# Altium footprint library CONN_RJ.PcbLib: 38 footprints (part 2 of 3)
Each footprint in its own frame and in the unit in brackets; x right, y up, seen from the top. Pads: shape width x height; smd on the part's side, far side on the other; paste and mask are expansions set on the pad; w line width, h text height; cw(c..) or ccw(c..) is an arc to the next point about the centre after c.
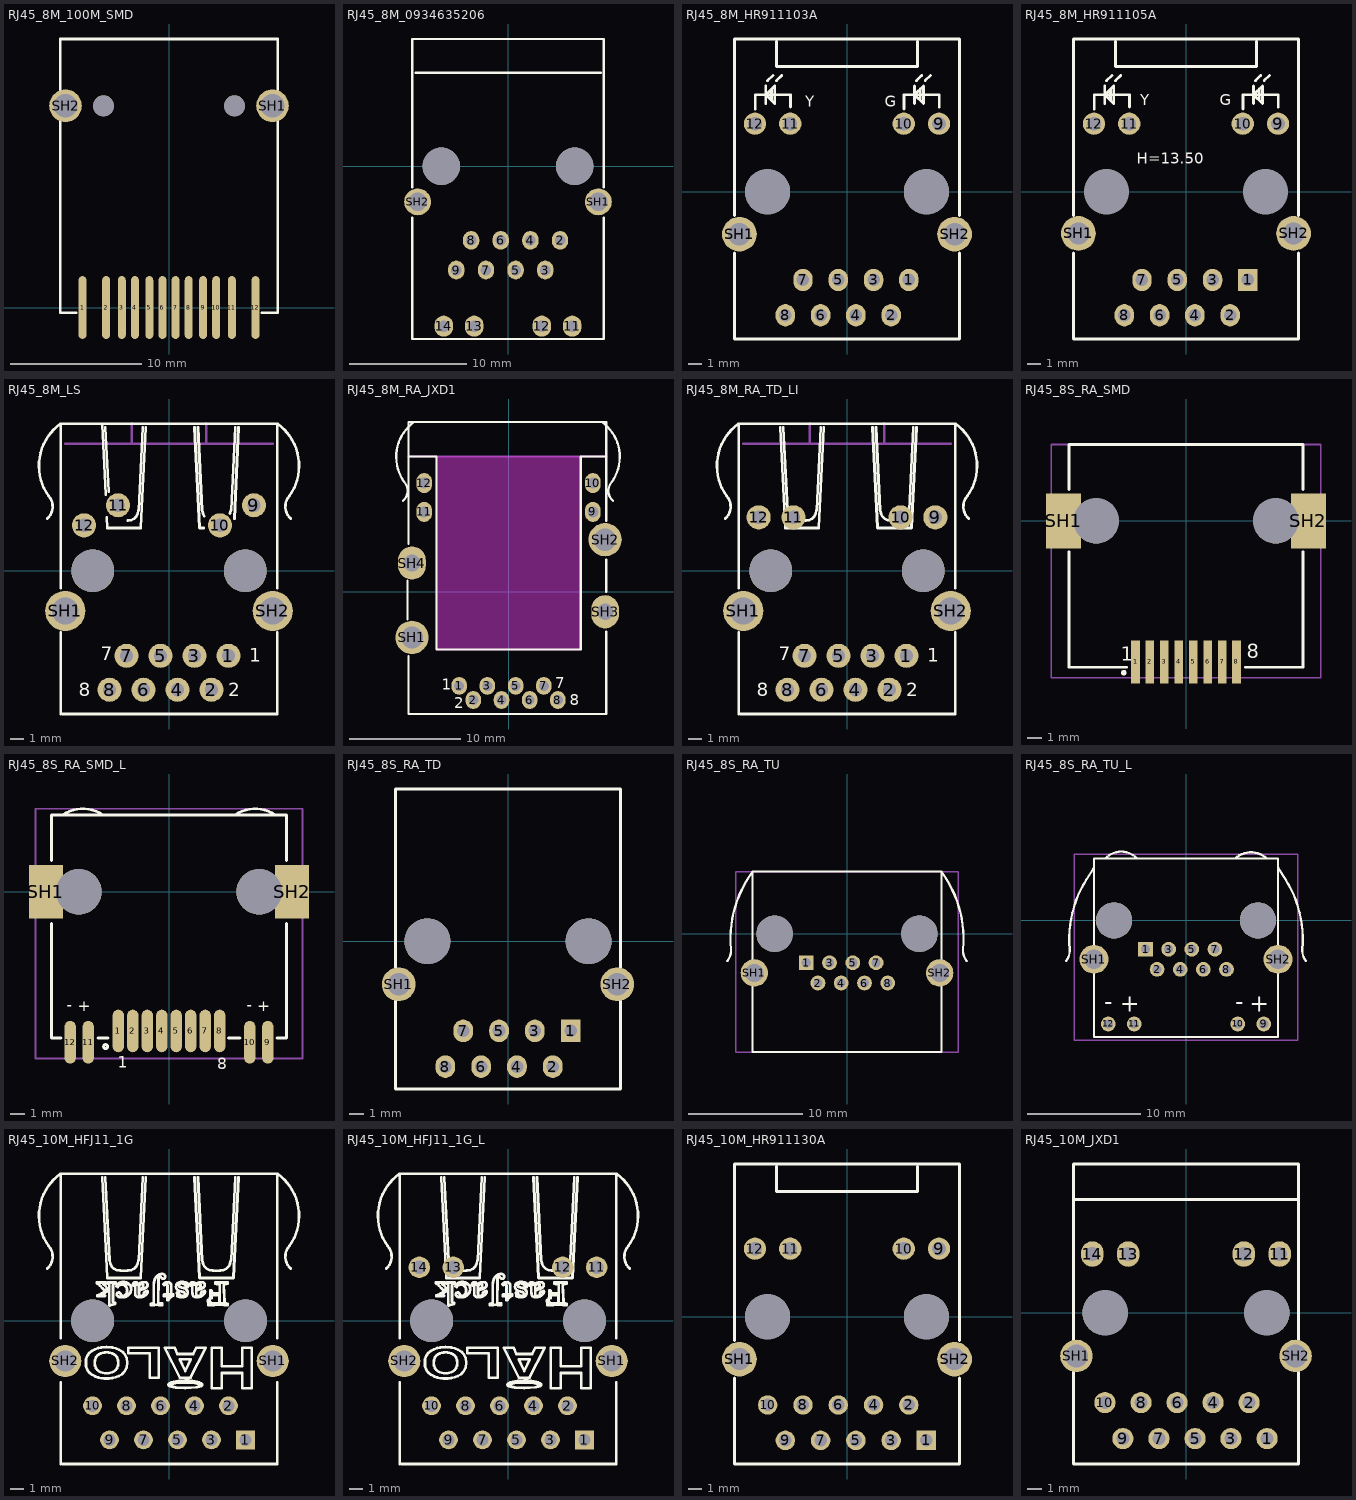
[diagram p1: the footprints below, top view; thin cyan lines are the x and y axes]

## RJ45_8M_100M_SMD [mm] "RJ45, 10/100BASE, MOLEX SMD WITH G/Y LED"
pads (16):
  oval 0.6x4.8 smd: 1(-6.6,0) 2(-4.8,0) 3(-3.6,0) 4(-2.6,0) 5(-1.5,0) 6(-0.5,0) 7(0.5,0) 8(1.5,0) 9(2.6,0) 10(3.6,0) 11(4.8,0) 12(6.6,0)
  round 2.5 hole 1.8: SH1(7.9,15.4) SH2(-7.9,15.4)
  round 1.6 hole 1.6: ""(-5,15.4) ""(5,15.4)
Top Overlay:
  lines w0.2: -7.1,-0.4 -8.3,-0.4 -8.3,20.5 8.3,20.5 8.3,-0.4 7.1,-0.4
3D body "480749001.stp": height 14.51, standoff -3.7, extent -9.153,-1.375 9.153,20.355

## RJ45_8M_0934635206 [mm] "RJ45, 10/100BASE, Up Tab, 0934635206 MOLEX"
height 14
pads (16):
  oval 1.4x1.6 hole 0.9: 2(4.46,-6.35) 3(3.19,-8.89) 4(1.92,-6.35) 5(0.65,-8.89) 6(-0.62,-6.35) 7(-1.89,-8.89) 8(-3.16,-6.35) 9(-4.43,-8.89)
  oval 1.6x1.8 hole 1: 11(5.5,-13.7) 12(2.9,-13.7) 13(-2.9,-13.7) 14(-5.5,-13.7)
  round 2.3 hole 1.6: SH1(7.745,-3.05) SH2(-7.745,-3.05)
  round 3.2 hole 3.2 unplated: ""(-5.715,0) ""(5.715,0)
Top Overlay:
  lines w0.2: -8.2,-4.4 -8.2,-14.8 8.2,-14.8 8.2,-4.4 ; -8.2,-1.8 -8.2,10.9 8.2,10.9 8.2,-1.8 ; -7.915,8.02 7.95,8.02
3D body "934635206.stp": height 14.14, standoff -3.26, extent -8.12,-14.6 8.12,10.8

## RJ45_8M_HR911103A [mm] "RJ45, 10/100BASE, HR911103A WITH G/Y LED"
height 10
pads (16):
  oval 1.4x1.6 hole 0.9: 1(4.45,-6.35) 2(3.18,-8.89) 3(1.91,-6.35) 4(0.64,-8.89) 5(-0.63,-6.35) 6(-1.9,-8.89) 7(-3.17,-6.35) 8(-4.44,-8.89)
  round 1.6 hole 1: 9(6.625,4.9) 10(4.085,4.9) 11(-4.085,4.9) 12(-6.625,4.9)
  round 2.5 hole 1.63: SH1(-7.745,-3.05) SH2(7.745,-3.05)
  round 3.251 hole 3.251 unplated: ""(-5.715,0) ""(5.715,0)
Top Overlay:
  lines w0.2: -8.1,-4.4 -8.1,-10.6 8.1,-10.6 8.1,-4.4 ; -8.1,-1.7 -8.1,11 8.1,11 8.1,-1.7 ; -6.604,5.969 -6.604,6.985 -4.064,6.985 -4.064,6.096 ; -5.842,6.35 -5.842,7.62 ; -5.715,8.001 -5.334,8.382 ; -5.434,6.592 -5.434,7.393 ; -5.08,8.001 -4.699,8.382 ; -5.08,10.795 -5.08,9.017 5.08,9.017 5.08,10.795 ; 4.106,5.969 4.106,6.985 6.646,6.985 6.646,6.096 ; 4.868,6.35 4.868,7.62 ; 4.995,8.001 5.376,8.382 ; 5.276,6.592 5.276,7.393 ; 5.63,8.001 6.011,8.382 ; -5.842,6.985 -5.207,7.62 -5.207,6.35 -5.842,6.985 ; 4.868,6.985 5.503,7.62 5.503,6.35 4.868,6.985
  text "G" at 2.713,6.123 h0.8
  text "Y" at -3.002,6.123 h0.8
3D body "User Library-HR911130A.STEP": height 13.5, standoff -3, extent -7.94,-10.5 7.94,10.9

## RJ45_8M_HR911105A [mm] "RJ45, 10/100BASE, HR911105A WITH G/Y LED"
height 14.8
pads (16):
  rect 1.4x1.6 hole 0.9: 1(4.45,-6.35)
  oval 1.4x1.6 hole 0.9: 2(3.18,-8.89) 3(1.91,-6.35) 4(0.64,-8.89) 5(-0.63,-6.35) 6(-1.9,-8.89) 7(-3.17,-6.35) 8(-4.44,-8.89)
  round 1.6 hole 1: 9(6.625,4.9) 10(4.085,4.9) 11(-4.085,4.9) 12(-6.625,4.9)
  round 2.5 hole 1.6: SH1(-7.745,-3) SH2(7.745,-3)
  round 2.95 hole 3.25 unplated: ""(-5.715,0) ""(5.715,0)
Top Overlay:
  lines w0.2: -8.1,-4.4 -8.1,-10.6 8.1,-10.6 8.1,-4.4 ; -8.1,-1.7 -8.1,11 8.1,11 8.1,-1.7 ; -6.604,5.969 -6.604,6.985 -4.064,6.985 -4.064,6.096 ; -5.842,6.35 -5.842,7.62 ; -5.715,8.001 -5.334,8.382 ; -5.434,6.592 -5.434,7.393 ; -5.08,8.001 -4.699,8.382 ; -5.08,10.795 -5.08,9.017 5.08,9.017 5.08,10.795 ; 4.106,5.969 4.106,6.985 6.646,6.985 6.646,6.096 ; 4.868,6.35 4.868,7.62 ; 4.995,8.001 5.376,8.382 ; 5.276,6.592 5.276,7.393 ; 5.63,8.001 6.011,8.382 ; -5.842,6.985 -5.207,7.62 -5.207,6.35 -5.842,6.985 ; 4.868,6.985 5.503,7.62 5.503,6.35 4.868,6.985
  text "G" at 2.413,6.223 h0.8
  text "Y" at -3.302,6.223 h0.8
  text "H=13.50" at -3.556,2.032 h0.8
3D body "User Library-HR911105A.step": height 13.5, standoff -3, extent -7.94,-10.5 7.94,10.9

## RJ45_8M_LS [mm] "HALO Ethernet FASTJACK with LED STAGGERED, RB1-125BAG1A"
pads (16):
  round 1.8 hole 1: 1(4.445,-6.35) 2(3.175,-8.89) 3(1.905,-6.35) 4(0.635,-8.89) 5(-0.635,-6.35) 6(-1.905,-8.89) 7(-3.175,-6.35) 8(-4.445,-8.89) 9(6.35,4.9) 10(3.81,3.4) 11(-3.81,4.9) 12(-6.35,3.4)
  round 3 hole 2: SH1(-7.75,-3) SH2(7.75,-3)
  round 3.2 hole 3.2 unplated: ""(-5.7,0) ""(5.7,0)
Top Overlay:
  lines w0.2: -9.1,3.9 ccw(c-9.9,4.8) -9,5.6 cw(c-5.85,7.85) -8.1,11 ; -8.1,-10.7 -8.1,-4.6 ; -8.1,-1.3 -8.1,11 ; -7.958,-10.7 8.1,-10.7 8.1,-4.6 ; -4.992,10.939 -4.737,5.698 ; -4.756,10.739 -4.5,5.9 ; -4.664,4.007 -4.625,3.206 -2.105,3.206 -1.738,10.739 ; -3.076,3.758 -2.84,3.784 -2.63,3.889 -2.446,4.072 -2.341,4.282 -2.289,4.519 ; -2.263,4.519 -1.974,10.739 ; 1.911,10.739 2.278,3.206 2.594,3.206 ; 2.173,10.739 2.462,4.519 ; 2.488,4.519 2.541,4.282 2.646,4.072 ; 4.561,4.282 4.614,4.519 ; 4.64,4.519 4.955,10.739 ; 4.9,3.9 5.191,10.739 ; 8.1,-1.3 8.1,11 ; 9.1,3.9 cw(c9.9,4.8) 9,5.6 ccw(c5.85,7.85) 8.1,11 ; -8.1,11 8.1,11
  text "8" at -6.731,-9.366 h1
  text "7" at -5.1,-6.7 h1
  text "2" at 4.445,-9.366 h1
  text "1" at 6,-6.8 h1
Mechanical 1:
  lines w0.2: -7.747,9.5 7.747,9.5 ; -2.794,9.5 -2.794,11 ; 2.794,9.5 2.794,11
3D body "User Library-HFJ11-1G01ER.step": height 15.82, standoff -2.88, extent -9.887,-10.8 10.106,10.99

## RJ45_8M_RA_JXD1 [mm] "Ethernet 10/100 JXD1-1001NL"
pads (16):
  oval 1.4x1.6 hole 0.9 mask+0.1: 1(-4.445,-8.47) 2(-3.175,-9.74) 3(-1.905,-8.47) 4(-0.635,-9.74) 5(0.635,-8.47) 6(1.905,-9.74) 7(3.175,-8.47) 8(4.445,-9.74)
  oval 1.4x1.8 hole 1 mask+0.1: 9(7.6,7.2) 10(7.6,9.8) 11(-7.6,7.2) 12(-7.6,9.8)
  round 3 hole 2: SH1(-8.7,-4.1) SH2(8.7,4.7)
  oval 2.5x3 hole 1.5 unplated: SH3(8.7,-1.8) SH4(-8.7,2.6)
Top Overlay:
  lines w0.2: -9.5,8.2 ccw(c-10.3,9.1) -9.4,9.9 cw(c-6.25,12.15) -8.5,15.3 ; -9.1,-2.5 -9.1,1 ; -9,-5.8 -9,-11 8.8,-11 8.8,-3.6 ; -9,4.3 -9,15.3 8.8,15.3 8.8,6.4 ; -9,12.2 -6.5,12.2 -6.5,-5.2 6.5,-5.2 6.5,12.2 8.8,12.2 ; 8.4,15.3 cw(c6.15,12.15) 9.3,9.9 ccw(c10.2,9.1) 9.4,8.2 ; 8.8,0 8.8,2.9
  text "1" at -6,-8.8 h1
  text "2" at -4.9,-10.5 h1
  text "7" at 4.2,-8.7 h1
  text "8" at 5.5,-10.2 h1
Keep-Out Layer:
  board cut-out: -6.5,12.2 -6.5,-5.2 6.5,-5.2 6.5,12.2
  lines w0.2: -6.5,12.2 -6.5,-5.2 6.5,-5.2 6.5,12.2
Mechanical 1:
  lines w0.2: -9,12.2 8.8,12.2
3D body "JXD1-1001NL.STEP": height 10.25, standoff -3.24, extent -10.189,-10.9 10.189,15.16

## RJ45_8M_RA_TD_LI [mm] "Ethernet FASTJACK MAGJACK with LED INLINE"
pads (16):
  round 1.8 hole 1 mask+0.1: 1(4.445,-6.35) 2(3.175,-8.89) 3(1.905,-6.35) 4(0.635,-8.89) 5(-0.635,-6.35) 6(-1.905,-8.89) 7(-3.175,-6.35) 8(-4.445,-8.89) 9(6.6,4) 10(4,4) 11(-4,4) 12(-6.6,4)
  round 3 hole 2: SH1(-7.75,-3) SH2(7.75,-3)
  round 3.2 hole 3.2 unplated: ""(-5.7,0) ""(5.7,0)
Top Overlay:
  lines w0.2: -9.1,3.9 ccw(c-9.9,4.8) -9,5.6 cw(c-5.85,7.85) -8.1,11 ; -8.1,-10.7 -8.1,-4.6 ; -8.1,-1.3 -8.1,11 ; -7.958,-10.7 8.1,-10.7 8.1,-4.6 ; -4.992,10.739 -4.625,3.206 -2.105,3.206 -1.738,10.739 ; -4.756,10.739 -4.441,4.519 -4.389,4.282 -4.284,4.072 -4.1,3.889 -3.89,3.784 -3.654,3.758 ; -3.654,3.731 -3.076,3.731 ; -3.076,3.758 -2.84,3.784 -2.63,3.889 -2.446,4.072 -2.341,4.282 -2.289,4.519 ; -2.263,4.519 -1.974,10.739 ; 1.911,10.739 2.278,3.206 4.824,3.206 5.191,10.739 ; 2.173,10.739 2.462,4.519 ; 2.488,4.519 2.541,4.282 2.646,4.072 2.829,3.889 3.039,3.784 3.275,3.758 ; 3.275,3.731 3.827,3.731 ; 3.827,3.758 4.063,3.784 4.273,3.889 4.457,4.072 4.561,4.282 4.614,4.519 ; 4.64,4.519 4.955,10.739 ; 8.1,-1.3 8.1,11 ; 9.1,3.9 cw(c9.9,4.8) 9,5.6 ccw(c5.85,7.85) 8.1,11 ; -8.1,11 8.1,11
  text "1" at 6,-6.8 h1
  text "2" at 4.445,-9.366 h1
  text "7" at -5.1,-6.7 h1
  text "8" at -6.731,-9.366 h1
Mechanical 1:
  lines w0.2: -7.747,9.5 7.747,9.5 ; -2.794,9.5 -2.794,11 ; 2.794,9.5 2.794,11
3D body "RJ45_45855.stp": height 15.09, standoff -3.47, extent -9.163,-10.92 9.163,10.92

## RJ45_8S_RA_SMD [mm] "RJ45, 8P8C, RightAngle, TabUp, SMD, WURTH 634008149721"
height 13
pads (12):
  rect 0.61x3.05 smd: 1(-3.57,-9.98) 2(-2.55,-9.98) 3(-1.53,-9.98) 4(-0.51,-9.98) 5(0.51,-9.98) 6(1.53,-9.98) 7(2.55,-9.98) 8(3.57,-9.98)
  rect 2.5x3.89 smd: SH1(-8.66,0) SH2(8.66,0)
  round 3.2 hole 3.2 unplated: ""(-6.35,0) ""(6.35,0)
Top Overlay:
  circle w0.2: c-4.4,-10.74 r0.1
  lines w0.2: -8.275,-2.19 -8.275,-10.35 -4.2,-10.35 ; -8.275,2.21 -8.275,5.4 8.275,5.4 8.275,2.21 ; 4.2,-10.35 8.275,-10.35 8.275,-2.19
  text "8" at 4.3,-9.7 h1
  text "1" at -4.6,-9.9 h1
Mechanical 13:
  lines w0.127: -9.525,-11.1 -9.525,5.4 9.525,5.4 9.525,-11.1 -9.525,-11.1
3D body "634008149721.stp": height 14.59, standoff -1.25, extent -9.525,-11.1 9.525,5.4

## RJ45_8S_RA_SMD_L [mm] "RJ45, 8P+G/Y-LED, RightAngle, TabUp, SMD, WURTH 634008137521"
height 13.48
pads (16):
  oval 0.8x3 smd: 1(-3.57,-9.8) 2(-2.55,-9.8) 3(-1.53,-9.8) 4(-0.51,-9.8) 5(0.51,-9.8) 6(1.53,-9.8) 7(2.55,-9.8) 8(3.57,-9.8) 9(6.955,-10.6) 10(5.685,-10.6) 11(-5.685,-10.6) 12(-6.955,-10.6)
  rect 2.4x3.8 smd: SH1(-8.66,0) SH2(8.66,0)
  round 3.2 hole 3.2 unplated: ""(-6.35,0) ""(6.35,0)
Top Overlay:
  circle w0.2: c-4.459,-10.9 r0.141
  lines w0.2: -8.275,-2.225 -8.275,-10.3 -7.6,-10.3 ; -8.275,2.2 -8.275,5.4 8.275,5.4 8.275,2.2 ; -7.48,5.4 cw(c-6.066,3.383) -4.656,5.404 ; -5,-10.3 -4.3,-10.3 ; 4.2,-10.3 5,-10.3 ; 4.656,5.404 cw(c6.066,3.383) 7.48,5.4 ; 8.275,-2.225 8.275,-10.3 7.6,-10.3 ; 7.6,-10.3 7.6,-10.3
  text "8" at 3.4,-12.5 h0.8
  text "1" at -3.6,-12.4 h0.8
  text "+" at -5.524,-7.744 h0.8
  text "-" at -6.794,-7.744 h0.8
  text "-" at 5.846,-7.744 h0.8
  text "+" at 7.116,-7.744 h0.8
Mechanical 13:
  lines w0.127: -9.4,-11.747 9.4,-11.747 9.4,5.847 -9.4,5.847 -9.4,-11.747
3D body "634008137521.stp": height 14.6, standoff -1.4, extent -9.4,-11.747 9.4,5.85

## RJ45_8S_RA_TD [mm] "RJ45, 8P, SHIELDED, RightAngle, TabDown, WURTH 615008142621"
height 13.3
pads (12):
  rect 1.4x1.6 hole 0.9: 1(4.445,-6.35)
  oval 1.4x1.6 hole 0.9: 2(3.175,-8.89) 3(1.905,-6.35) 4(0.635,-8.89) 5(-0.635,-6.35) 6(-1.905,-8.89) 7(-3.175,-6.35) 8(-4.445,-8.89)
  round 2.4 hole 1.6: SH1(-7.75,-3.05) SH2(7.75,-3.05)
  round 3.25 hole 3.25 unplated: ""(-5.715,0) ""(5.715,0)
Top Overlay:
  lines w0.2: -7.977,-10.475 7.978,-10.475 7.978,10.8 -7.977,10.8 -7.977,-10.475
3D body "615008142621.stp": height 13.66, standoff -3.68, extent -7.94,-10.4 7.94,10.8

## RJ45_8S_RA_TU [mm] "RJ45, 8P, SHIELDED, RightAngle, TabUP, WURTH 615008140621"
height 13.25
pads (12):
  rect 1.3x1.3 hole 0.8: 1(-3.57,-2.54)
  round 1.3 hole 0.8: 2(-2.55,-4.32) 3(-1.53,-2.54) 4(-0.51,-4.32) 5(0.51,-2.54) 6(1.53,-4.32) 7(2.55,-2.54) 8(3.57,-4.32)
  round 2.4 hole 1.6: SH1(-8.125,-3.43) SH2(8.125,-3.43)
  round 3.2 hole 3.2 unplated: ""(-6.35,0) ""(6.35,0)
Top Overlay:
  lines w0.2: -10.489,-2.386 ccw(c-11.66,-1.464) -10.174,-1.338 cw(c-0.302,-0.457) -8.707,4.796 -8.288,5.46 ; 10.489,-2.386 cw(c11.66,-1.464) 10.174,-1.338 ccw(c0.302,-0.457) 8.707,4.796 8.288,5.46 ; -8.288,5.46 8.288,5.46 ; -8.288,5.46 -8.288,-10.365 8.288,-10.365 8.288,5.46 ; -8.288,5.46 8.288,5.46
Mechanical 13:
  lines w0.127: -9.75,-10.365 -9.75,5.46 9.75,5.46 9.75,-10.365 -9.75,-10.365
3D body "615008140621.stp": height 14.52, standoff -3.72, extent -9.75,-10.44 9.75,5.41

## RJ45_8S_RA_TU_L [mm] "RJ45, 8P+LED, SHIELDED, RightAngle, TabUP, WURTH 615008137421"
height 13.25
pads (16):
  rect 1.3x1.3 hole 0.8: 1(-3.57,-2.54)
  round 1.3 hole 0.8: 2(-2.55,-4.32) 3(-1.53,-2.54) 4(-0.51,-4.32) 5(0.51,-2.54) 6(1.53,-4.32) 7(2.55,-2.54) 8(3.57,-4.32) 9(6.86,-9.14) 10(4.57,-9.14) 11(-4.57,-9.14) 12(-6.86,-9.14)
  round 2.55 hole 1.7: SH1(-8.125,-3.43) SH2(8.125,-3.43)
  round 3.2 hole 3.2 unplated: ""(-6.35,0) ""(6.35,0)
Top Overlay:
  lines w0.2: -10.575,-3.57 ccw(c-11.746,-2.647) -10.261,-2.522 cw(c-0.388,-1.641) -8.793,3.613 -8.181,4.581 ; -7.112,5.462 cw(c-5.72,4.185) -4.324,5.458 ; 4.325,5.462 cw(c5.734,3.912) 7.148,5.458 ; 8.133,4.658 8.768,3.652 ; 8.793,3.612 cw(c0.389,-1.641) 10.261,-2.522 ccw(c11.746,-2.647) 10.575,-3.57 ; -8.125,-10.29 8.125,-10.29 8.125,5.46 -8.125,5.46 -8.125,-10.29
  text "-" at -6.477,-6.732 h1.52
  text "-" at 5.08,-6.732 h1.52
  text "+" at -4.064,-6.732 h1.52
  text "+" at 7.366,-6.732 h1.52
Mechanical 13:
  lines w0.12: -9.875,-10.59 -9.875,5.86 9.875,5.86 9.875,-10.59 -9.875,-10.59
3D body "615008137421.stp": height 15.23, standoff -3.21, extent -9.875,-10.59 9.875,5.86

## RJ45_10M_HFJ11_1G [mm] "RJ45_HFJ11_1G01E (HALO Ethernet Gigabit FASTJACK), Down Tab"
height 14
pads (14):
  rect 1.4x1.4 hole 0.9: 1(5.715,-8.9)
  round 1.4 hole 0.9: 2(4.445,-6.35) 3(3.175,-8.9) 4(1.905,-6.35) 5(0.635,-8.9) 6(-0.635,-6.35) 7(-1.905,-8.9) 8(-3.175,-6.35) 9(-4.445,-8.9) 10(-5.715,-6.35)
  round 2.4 hole 1.6: SH1(7.75,-3) SH2(-7.75,-3)
  round 3.2 hole 3.2 unplated: ""(-5.71,0) ""(5.72,0)
Top Overlay:
  drawing of 1252 lines, arcs and shapes, not listed
3D body "User Library-HFJ11-1G01ER.step": height 15.82, standoff -2.88, extent -9.897,-10.8 10.097,10.99

## RJ45_10M_HFJ11_1G_L [mm] "RJ45_HFJ11 (HALO Ethernet Gigabit FASTJACK) WITH LED, Down Tab"
height 14
pads (18):
  rect 1.4x1.4 hole 0.9: 1(5.715,-8.9)
  round 1.4 hole 0.9: 2(4.445,-6.35) 3(3.175,-8.9) 4(1.905,-6.35) 5(0.635,-8.9) 6(-0.635,-6.35) 7(-1.905,-8.9) 8(-3.175,-6.35) 9(-4.445,-8.9) 10(-5.715,-6.35)
  round 1.6 hole 1: 11(6.625,4) 12(4.085,4) 13(-4.085,4) 14(-6.625,4)
  round 2.4 hole 1.6: SH1(7.75,-3) SH2(-7.75,-3)
  round 3.2 hole 3.2 unplated: ""(-5.71,0) ""(5.72,0)
Top Overlay:
  drawing of 1252 lines, arcs and shapes, not listed
3D body "User Library-HFJ11-1G01ER.step": height 15.82, standoff -2.88, extent -9.897,-10.8 10.097,10.99

## RJ45_10M_HR911130A [mm] "RJ45, 1000BASE with Magnet, HR911130A WITH G/Y LED, Down Tab"
height 10
pads (18):
  rect 1.4x1.4 hole 0.9: 1(5.72,-8.9)
  round 1.4 hole 0.9: 2(4.45,-6.35) 3(3.18,-8.9) 4(1.91,-6.35) 5(0.64,-8.9) 6(-0.63,-6.35) 7(-1.9,-8.9) 8(-3.17,-6.35) 9(-4.44,-8.9) 10(-5.71,-6.35)
  round 1.6 hole 1: 9(6.625,4.9) 10(4.085,4.9) 11(-4.085,4.9) 12(-6.625,4.9)
  round 2.5 hole 1.6: SH1(-7.745,-3.05) SH2(7.745,-3.05)
  round 3.251 hole 3.251 unplated: ""(-5.715,0) ""(5.715,0)
Top Overlay:
  lines w0.2: -8.1,-4.4 -8.1,-10.6 8.1,-10.6 8.1,-4.4 ; -8.1,-1.7 -8.1,11 8.1,11 8.1,-1.7 ; -5.08,10.795 -5.08,9.017 5.08,9.017 5.08,10.795
3D body "User Library-HR911130A.STEP": height 13.5, standoff -3, extent -7.94,-10.5 7.94,10.9

## RJ45_10M_JXD1 [mm] "RJ45, 10/100BASE, Up Tab"
height 2.25
pads (18):
  round 1.5 hole 0.9: 1(5.73,-8.89) 2(4.46,-6.35) 3(3.18,-8.89) 4(1.91,-6.35) 5(0.64,-8.89) 6(-0.635,-6.35) 7(-1.91,-8.89) 8(-3.18,-6.35) 9(-4.46,-8.89) 10(-5.73,-6.35)
  oval 1.6x1.8 hole 1: 11(6.625,4.15) 12(4.085,4.15) 13(-4.085,4.15) 14(-6.625,4.15)
  round 2.3 hole 1.6: SH1(-7.745,-3.05) SH2(7.745,-3.05)
  round 3.2 hole 3.2 unplated: ""(-5.715,0) ""(5.715,0)
Top Overlay:
  lines w0.2: -7.95,-10.668 -7.95,10.52 ; -7.94,-10.69 7.94,-10.69 ; -7.94,10.52 7.94,10.52 ; -7.915,8.02 7.95,8.02 ; 7.95,-10.668 7.95,10.52
3D body "JXD1-0008NL.step": height 15.7, standoff -3.7, extent -9.875,-10.5 9.875,11.75